# Altium footprint library Miscellaneous Devices LC.PcbLib: 776 footprints (part 6 of 49)
Each footprint in its own frame and in the unit in brackets; x right, y up, seen from the top. Pads: shape width x height; smd on the part's side, far side on the other; paste and mask are expansions set on the pad; w line width, h text height; cw(c..) or ccw(c..) is an arc to the next point about the centre after c.
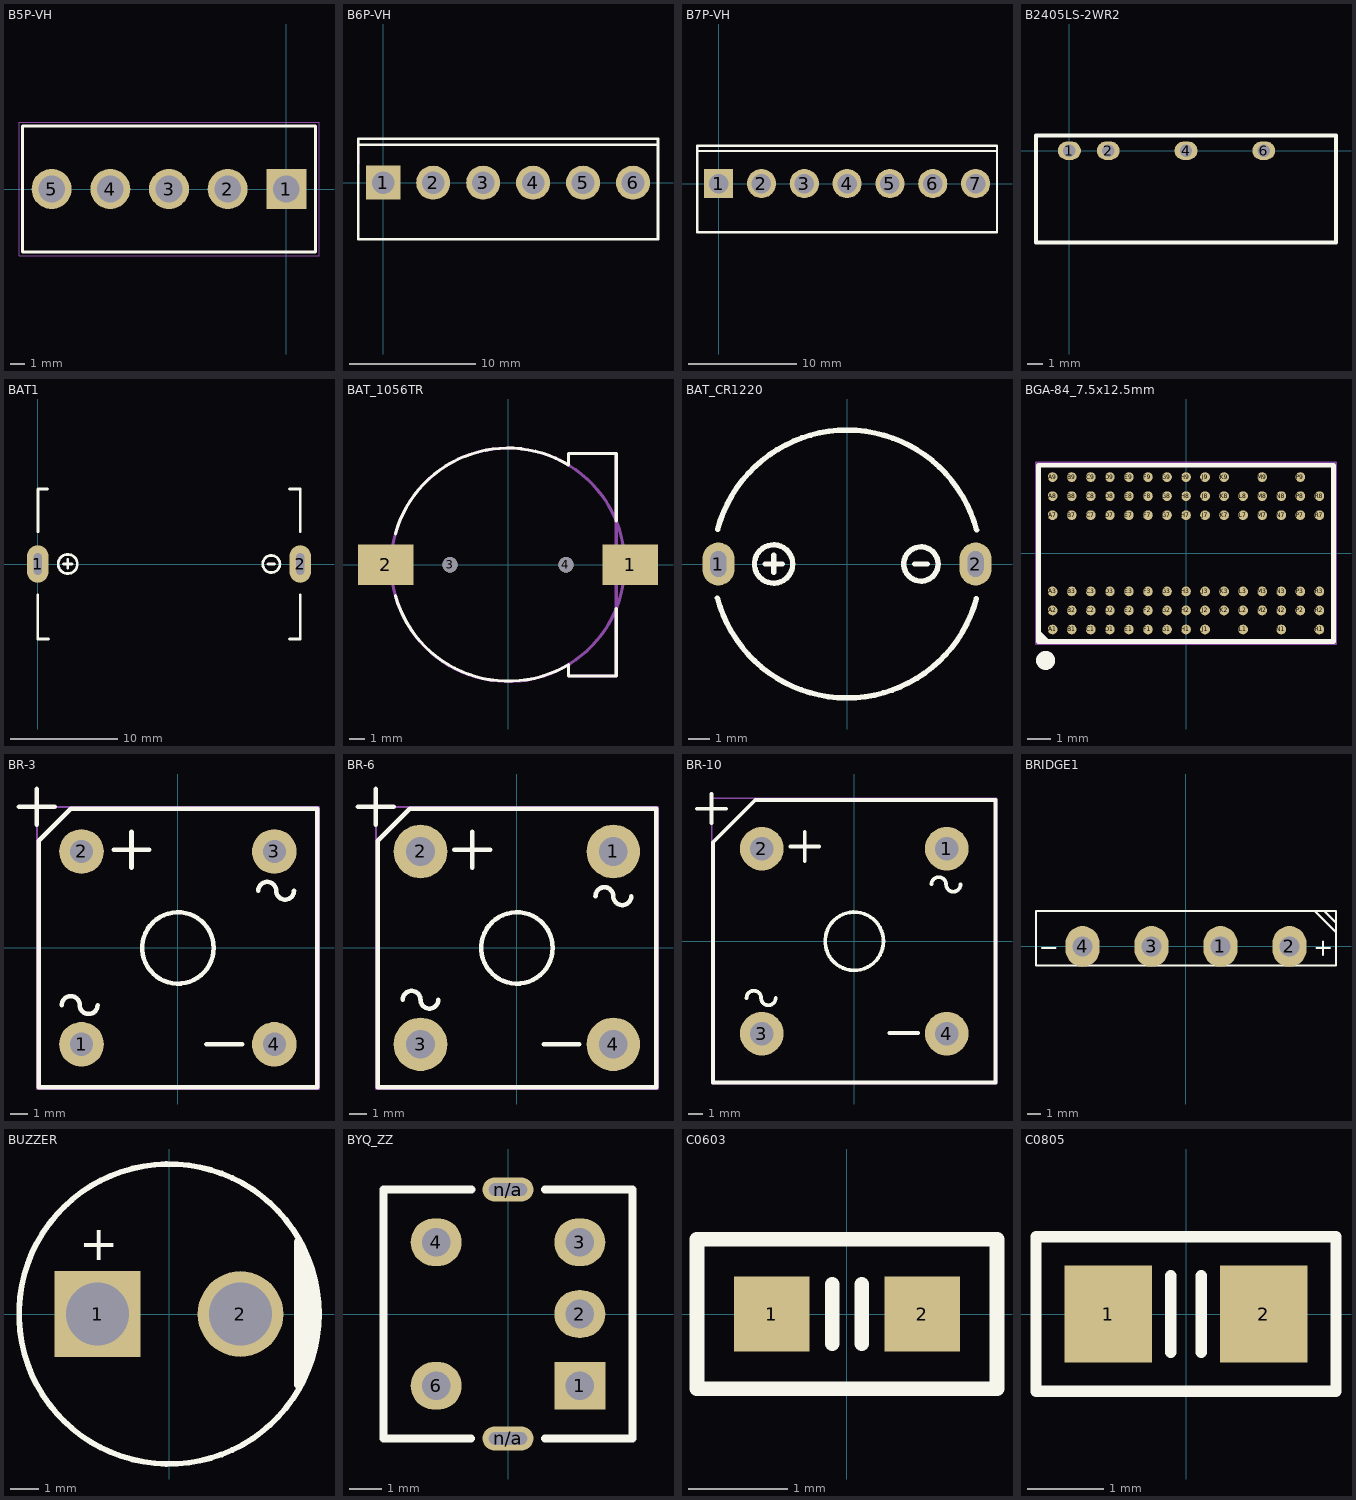
[diagram p5: the footprints below, top view; thin cyan lines are the x and y axes]

## B5P-VH [mm]
pads (5):
  rect 2.7x2.7 / inner round 2.7 / far side rect 2.7x2.7 hole 1.8: 1(0,0)
  round 2.7 hole 1.8: 2(-3.96,0) 3(-7.92,0) 4(-11.88,0) 5(-15.84,0)
Top Overlay:
  lines w0.2: -17.79,-4.25 -17.79,4.25 1.95,4.25 1.95,-4.25 -17.79,-4.25
Mechanical 15:
  lines w0.1: -17.79,-4.25 -17.79,4.25 1.95,4.25 1.95,-4.25 -17.79,-4.25
Mechanical 20:
  lines w0.05: -18.04,-4.5 -18.04,4.5 2.2,4.5 2.2,-4.5 -18.04,-4.5

## B6P-VH [mm]
pads (6):
  rect 2.7x2.7 / inner round 2.7 / far side rect 2.7x2.7 hole 1.8: 1(0,0)
  round 2.7 hole 1.8: 2(3.96,0) 3(7.92,0) 4(11.88,0) 5(15.84,0) 6(19.8,0)
Top Overlay:
  lines w0.2: -1.895,3 21.78,3 ; -1.98,-4.5 -1.98,3.5 21.78,3.5 21.78,-4.5 -1.98,-4.5
Mechanical 15:
  lines w0.1: -1.953,3.5 -2,-4.5 21.78,-4.5 21.78,3.5 -1.95,3.5
Mechanical 20:
  lines w0.05: -1.98,-4.5 21.78,-4.5 21.78,3.5 -1.98,3.5 -1.98,-4.5

## B7P-VH [mm]
pads (7):
  rect 2.7x2.7 / inner round 2.7 / far side rect 2.7x2.7 hole 1.8: 1(0,0)
  round 2.7 hole 1.8: 2(3.96,0) 3(7.92,0) 4(11.88,0) 5(15.84,0) 6(19.8,0) 7(23.76,0)
Top Overlay:
  lines w0.2: -1.895,3 25.7,3 ; -1.98,-4.5 -1.98,3.5 25.74,3.5 25.74,-4.5 -1.98,-4.5
Mechanical 15:
  lines w0.1: -1.953,3.5 -2,-4.5 25.74,-4.5 25.74,3.5 -1.95,3.5
Mechanical 20:
  lines w0.05: -1.98,-4.5 25.74,-4.5 25.74,3.5 -1.98,3.5 -1.98,-4.5

## B2405LS-2WR2 [mm]
pads (4):
  oval 1.5x1.2 hole 0.8: 1(0,0) 2(2.54,0) 4(7.62,0) 6(12.7,0)
Top Overlay:
  lines w0.254: -2.18,-6 -2.18,1 17.42,1 17.42,-6 -2.18,-6
3D body "B_S-2WR2.STEP": height 10.16, standoff -4.1, extent -2.205,-6.065 17.445,0.985

## BAT1 [mm]
pads (2):
  oval 2x3.5 hole 0.75 slot 2 at 90 deg: 1(0,0) 2(24.5,0)
Top Overlay:
  circle w0.254: c21.8,0 r0.8
  circle w0.254: c2.8,0 r0.894
  lines w0.254: 0,-2.9 0,-7 1,-7 ; 0.014,3.014 0.014,6.286 0.014,7 0.9,7 ; 2.4,0 3.2,0 ; 2.8,-0.386 2.8,0.414 ; 21.5,0 22.1,0 ; 23.5,-7 24.5,-7 24.5,-2.9 ; 23.5,7 24.5,7 24.5,3

## BAT_1056TR [mm]
pads (4):
  rect 3.6x2.6 smd: 1(7.9,0) 2(-7.9,0)
  round 1 hole 1 unplated: 3(-3.75,0) 4(3.75,0)
Top Overlay:
  lines w0.2: -7.279,-2.005 ccw(c0.025,0.062) 3.911,-6.458 ; -7.279,2.005 cw(c0,0) 3.911,6.458 ; 3.909,-6.438 3.909,-7.2 7,-7.2 7,-2.829 ; 3.909,6.459 3.909,7.2 7,7.2 7,2.829
Mechanical 15:
  circle w0.2: c0,0 r7.55
  lines w0.2: 3.909,-6.438 3.909,-7.2 7,-7.2 7,7.2 3.909,7.2 3.909,6.439

## BAT_CR1220 [mm] "CR1220卧式"
pads (2):
  oval 1.5x2 hole 0.75 slot 1.2 at 90 deg: 1(-6,0) 2(6,0)
Top Overlay:
  circle w0.254: c3.45,0 r0.8
  circle w0.254: c-3.425,0 r0.894
  lines w0.254: -6.045,-1.586 ccw(c0,0) 6.039,-1.61 ; -6.039,1.61 cw(c0,0) 6.045,1.586 ; -3.825,0 -3.025,0 ; -3.425,-0.386 -3.425,0.414 ; 3.15,0 3.75,0

## BGA-84_7.5x12.5mm [mm]
pads (84):
  round 0.41 smd mask+0.051: A1(-5.6,-3.2) A2(-5.6,-2.4) A3(-5.6,-1.6) A7(-5.6,1.6) A8(-5.6,2.4) A9(-5.6,3.2) B1(-4.8,-3.2) B2(-4.8,-2.4) B3(-4.8,-1.6) B7(-4.8,1.6) B8(-4.8,2.4) B9(-4.8,3.2) C1(-4,-3.2) C2(-4,-2.4) C3(-4,-1.6) C7(-4,1.6) C8(-4,2.4) C9(-4,3.2) D1(-3.2,-3.2) D2(-3.2,-2.4) D3(-3.2,-1.6) D7(-3.2,1.6) D8(-3.2,2.4) D9(-3.2,3.2) E1(-2.4,-3.2) E2(-2.4,-2.4) E3(-2.4,-1.6) E7(-2.4,1.6) E8(-2.4,2.4) E9(-2.4,3.2) F1(-1.6,-3.2) F2(-1.6,-2.4) F3(-1.6,-1.6) F7(-1.6,1.6) F8(-1.6,2.4) F9(-1.6,3.2) G1(-0.8,-3.2) G2(-0.8,-2.4) G3(-0.8,-1.6) G7(-0.8,1.6) G8(-0.8,2.4) G9(-0.8,3.2) H1(0,-3.2) H2(0,-2.4) H3(0,-1.6) H7(0,1.6) H8(0,2.4) H9(0,3.2) J1(0.8,-3.2) J2(0.8,-2.4) J3(0.8,-1.6) J7(0.8,1.6) J8(0.8,2.4) J9(0.8,3.2) K2(1.6,-2.4) K3(1.6,-1.6) K7(1.6,1.6) K8(1.6,2.4) K9(1.6,3.2) L1(2.4,-3.2) L2(2.4,-2.4) L3(2.4,-1.6) L7(2.4,1.6) L8(2.4,2.4) M2(3.2,-2.4) M3(3.2,-1.6) M7(3.2,1.6) M8(3.2,2.4) M9(3.2,3.2) N1(4,-3.2) N2(4,-2.4) N3(4,-1.6) N7(4,1.6) N8(4,2.4) P2(4.8,-2.4) P3(4.8,-1.6) P7(4.8,1.6) P8(4.8,2.4) P9(4.8,3.2) R1(5.6,-3.2) R2(5.6,-2.4) R3(5.6,-1.6) R7(5.6,1.6) R8(5.6,2.4)
Top Overlay:
  circle w0.4: c-5.9,-4.5 r0.2
  region: -6.197,-3.697 -5.7,-3.697 -5.999,-3.399 -6.197,-3.2
  lines w0.2: -6.2,-3.7 6.2,-3.7 6.2,3.7 -6.2,3.7 -6.2,-3.7
Mechanical 13:
  lines w0.1: -6.3,-3.8 -6.3,3.8 6.3,3.8 6.3,-3.8 -6.3,-3.8

## BR-3 [mm]
pads (4):
  round 2.5 hole 1.3: 1(-5.4,-5.4) 2(-5.4,5.4) 3(5.4,5.4) 4(5.4,-5.4)
Top Overlay:
  circle w0.254: c0,0 r2
  lines w0.254: -8.9,7.9 -6.9,7.9 ; -7.9,6.9 -7.9,8.9 ; -6.5,-3.2 cw(c-6,-3.2) -5.5,-3.2 ccw(c-5,-3.2) -4.5,-3.2 ; -3.6,5.5 -1.6,5.5 ; -2.6,4.5 -2.6,6.5 ; 1.6,-5.4 3.6,-5.4 ; 4.5,3.2 cw(c5,3.2) 5.5,3.2 ccw(c6,3.2) 6.5,3.2 ; -7.8,-7.8 7.8,-7.8 7.8,7.8 -6,7.8 -7.8,6 -7.8,-7.8
Mechanical 13:
  lines w0.1: -7.9,-7.9 7.9,-7.9 7.9,7.9 -7.9,7.9 -7.9,-7.9

## BR-6 [mm]
pads (4):
  round 3 hole 1.6: 1(5.4,5.4) 2(-5.4,5.4) 3(-5.4,-5.4) 4(5.4,-5.4)
Top Overlay:
  circle w0.254: c0,0 r2
  lines w0.254: -8.9,7.9 -6.9,7.9 ; -7.9,6.9 -7.9,8.9 ; -6.4,-2.9 cw(c-5.9,-2.9) -5.4,-2.9 ccw(c-4.9,-2.9) -4.4,-2.9 ; -3.5,5.5 -1.5,5.5 ; -2.5,4.5 -2.5,6.5 ; 1.5,-5.4 3.5,-5.4 ; 4.4,2.9 cw(c4.9,2.9) 5.4,2.9 ccw(c5.9,2.9) 6.4,2.9 ; -7.8,-7.8 -7.8,6 -6,7.8 7.8,7.8 7.8,-7.8 -7.8,-7.8
Mechanical 13:
  lines w0.1: -7.9,-7.9 -7.9,7.9 7.9,7.9 7.9,-7.9 -7.9,-7.9

## BR-10 [mm]
pads (4):
  round 3 hole 1.6: 1(6.35,6.35) 2(-6.35,6.35) 3(-6.35,-6.35) 4(6.35,-6.35)
Top Overlay:
  circle w0.254: c0,0 r2
  lines w0.254: -10.8,9.1 -8.8,9.1 ; -9.8,8.1 -9.8,10.1 ; -7.4,-3.9 cw(c-6.9,-3.9) -6.4,-3.9 ccw(c-5.9,-3.9) -5.4,-3.9 ; -4.4,6.5 -2.4,6.5 ; -3.4,5.5 -3.4,7.5 ; 2.4,-6.3 4.4,-6.3 ; 5.3,3.9 cw(c5.8,3.9) 6.3,3.9 ccw(c6.8,3.9) 7.3,3.9 ; -9.7,-9.7 -9.7,6.8 -6.8,9.7 9.7,9.7 9.7,-9.7 -9.7,-9.7
Mechanical 13:
  lines w0.1: -9.8,-9.8 -9.8,9.8 9.8,9.8 9.8,-9.8 -9.8,-9.8

## BRIDGE1 [mm]
pads (4):
  oval 2.5x3 hole 1.5: 1(2.54,0) 2(7.62,0) 3(-2.54,0) 4(-7.62,0)
Top Overlay:
  lines w0.15: -10.6,-0.13 -9.6,-0.13 ; 9.5,2.6 11.049,1.051 ; 9.6,-0.13 10.6,-0.13 ; 10.1,-0.63 10.1,0.37 ; 10.2,2.6 11.049,1.751 ; -11.049,-1.4 11.049,-1.4 11.049,2.6 -11.049,2.6 -11.049,-1.4
3D body "bridge 2.STEP": height 21.3, standoff -15.33, extent -11.249,-1.216 11.051,2.544

## BUZZER [mm] "蜂鸣器"
pads (2):
  rect 3x3 hole 2.2: 1(-2.5,0)
  round 3 hole 2.2: 2(2.5,0)
Top Overlay:
  circle w0.2: c0,0 r5.25
  lines w0.254: 4.5,-2.475 4.5,2.525 ; 4.6,-2.175 4.65,2.2 ; 4.775,-1.95 4.775,1.925 ; 4.9,-1.575 4.925,1.5 ; 5.025,-1.05 5.05,1.025
  text "+" at -3.15,1.88 h1.2
3D body "10X12.STEP": height 12, standoff -2.5, extent -4.833,-4.92 5.167,5.08

## BYQ_ZZ [mm] "中周变压器"
height 10
pads (7):
  rect 1.6x1.5 hole 0.9: 1(2.25,-2.25)
  oval 1.6x1.5 hole 0.9: 2(2.25,0) 3(2.25,2.25) 4(-2.25,2.25) 6(-2.25,-2.25)
  oval 1.6x0.75 hole 0.4 slot 1.2 at 0 deg: n/a(0,-3.9) n/a(0,3.9)
Top Overlay:
  lines w0.254: -3.9,3.9 -3.9,-3.9 -1.154,-3.9 ; -3.889,3.9 -1.143,3.9 ; 1.154,-3.9 3.9,-3.9 3.9,3.9 1.154,3.9

## C0603 [mil]
pads (2):
  rect 30x30 smd: 1(-30,0) 2(30,0)
Top Overlay:
  lines w5.91: -5.91,-11.81 -5.91,11.81 ; 5.91,-11.81 5.91,11.81 ; -59.76,-29.76 -59.76,29.76 59.76,29.76 59.76,-29.76 -59.76,-29.76
3D body "0603_C.step": height 34.65, standoff 0, extent -30,-15 32.99,16.89

## C0805 [mil]
pads (2):
  rect 45x50 smd: 1(-40,0) 2(40,0)
Top Overlay:
  lines w5.91: -7.87,-19.68 -7.87,19.69 ; 7.87,-19.68 7.87,19.69 ; -77.26,-39.76 77.26,-39.76 77.26,39.76 -77.26,39.76 -77.26,-39.76
3D body "0805_C.step": height 36.22, standoff 0, extent -41.54,-23.27 37.6,25.95